# Altium footprint library Molex FFC - FPC Connectors (Through-Hole).PcbLib: 219 footprints (part 13 of 14)
Each footprint in its own frame and in the unit in brackets; x right, y up, seen from the top. Pads: shape width x height; smd on the part's side, far side on the other; paste and mask are expansions set on the pad; w line width, h text height; cw(c..) or ccw(c..) is an arc to the next point about the centre after c.
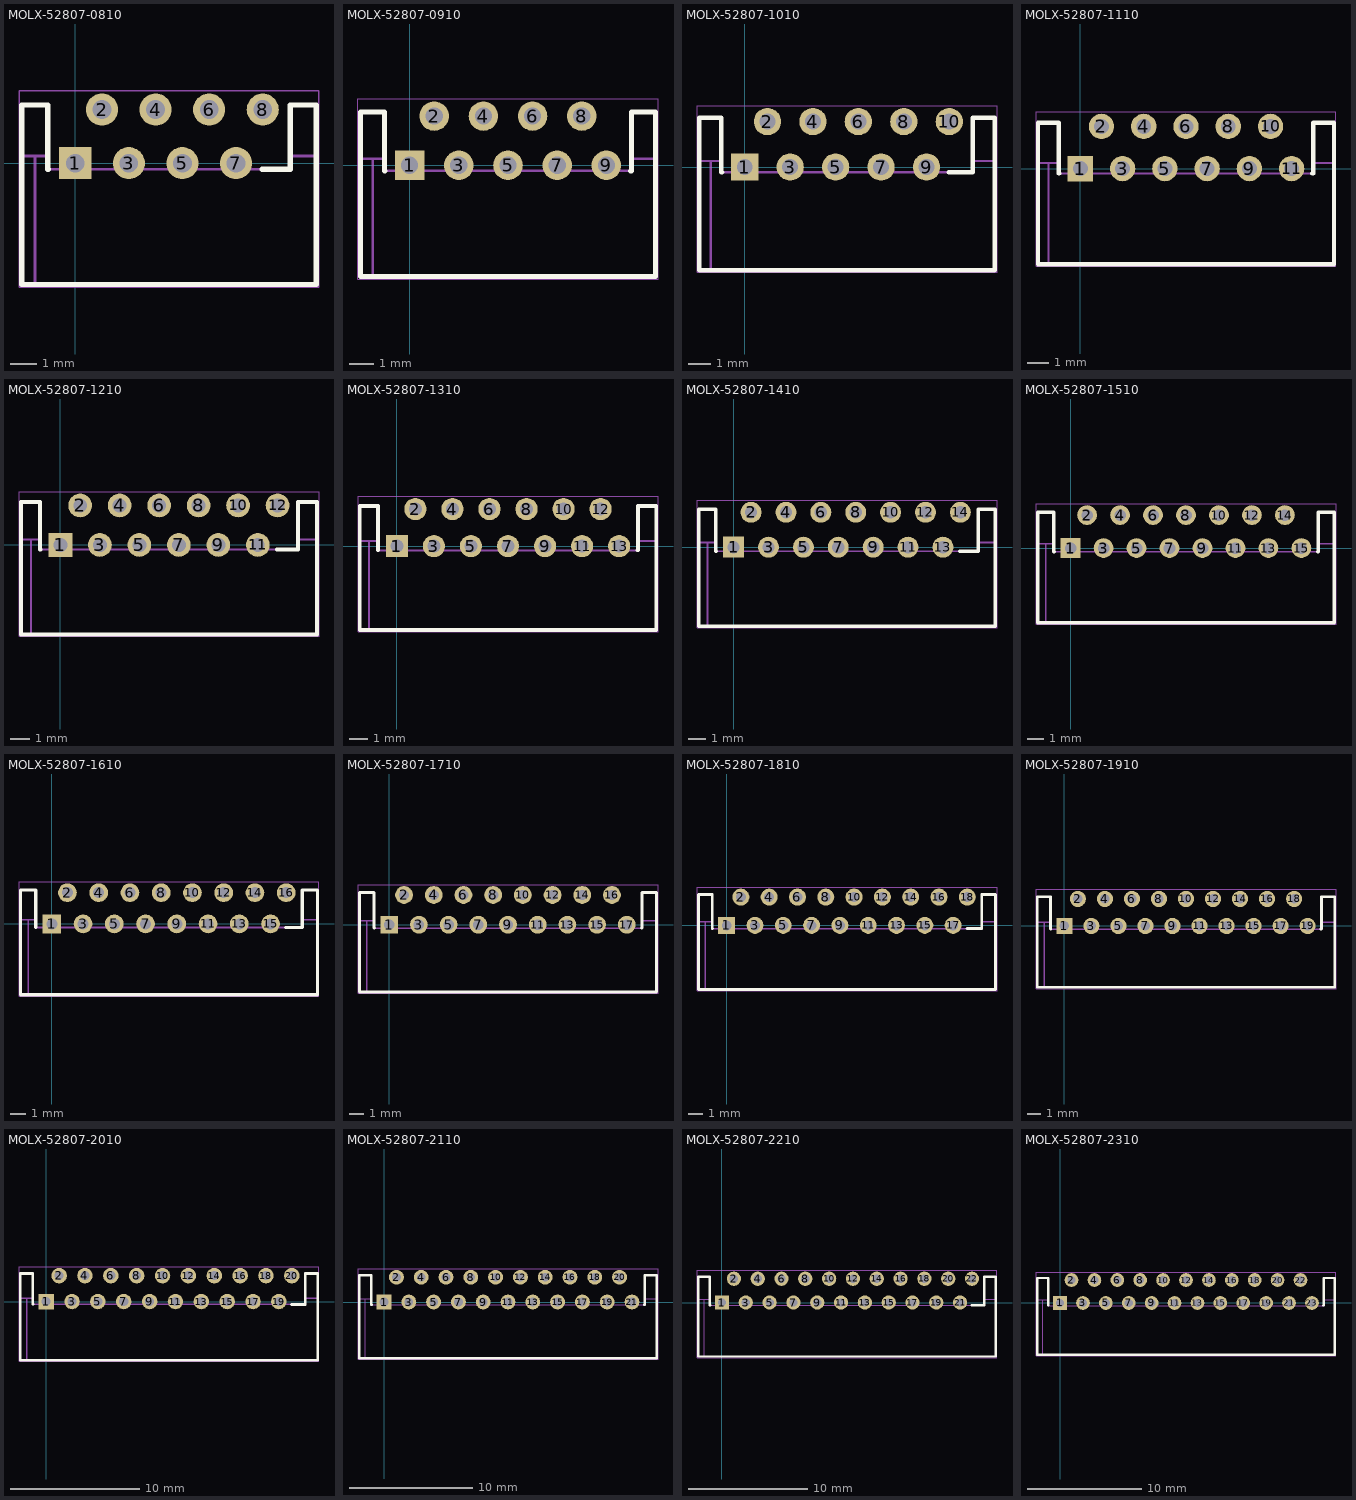
[diagram p12: the footprints below, top view; thin cyan lines are the x and y axes]

## MOLX-52807-0810 [mm] "FFC Connector, 8-Leads, Right Angle, Pitch 1.0 mm, Mated Height 3.6 mm, Through Hole"
height 3.612
pads (8):
  rect 1.2x1.2 hole 0.7: 1(0,0)
  round 1.2 hole 0.7: 2(1,2) 3(2,0) 4(3,2) 5(4,0) 6(5,2) 7(6,0) 8(7,2)
Top Overlay:
  lines w0.2: -1,-0.225 -1.025,-0.225 -1.025,2.17 -2,2.17 ; 6.973,-0.23 8.025,-0.23 8.025,2.17 9,2.17 9,-4.53 -2,-4.53 -2,2.17 ; -2,2.17 -2,2.17
Mechanical 13:
  lines w0.1: -2,0.27 -1.025,0.27 ; -1.5,-4.53 -1.5,0.27 ; 8.025,0.27 9,0.27 ; -2,-4.53 9,-4.53 9,2.17 8.025,2.17 8.025,-0.23 -1.025,-0.23 -1.025,2.17 -2,2.17 -2,-4.53
Mechanical 15:
  lines w0.05: -2.1,-4.63 9.1,-4.63 9.1,2.7 -2.1,2.7 -2.1,-4.63
3D body "52807-0810.stp": height 3.61, standoff -3.19, extent -2,-4.53 9,2.17

## MOLX-52807-0910 [mm] "FFC Connector, 9-Leads, Right Angle, Pitch 1.0 mm, Mated Height 3.6 mm, Through Hole"
height 3.612
pads (9):
  rect 1.2x1.2 hole 0.7: 1(0,0)
  round 1.2 hole 0.7: 2(1,2) 3(2,0) 4(3,2) 5(4,0) 6(5,2) 7(6,0) 8(7,2) 9(8,0)
Top Overlay:
  lines w0.2: -1,-0.23 -1.025,-0.23 -1.025,2.17 -2,2.17 ; 8.973,-0.23 9.025,-0.23 9.025,2.17 10,2.17 10,-4.53 -2,-4.53 -2,2.17 ; -2,2.17 -2,2.17
Mechanical 13:
  lines w0.1: -2,0.27 -1.025,0.27 ; -1.5,-4.53 -1.5,0.27 ; 9.025,0.27 10,0.27 ; -2,-4.53 -2,2.17 -1.025,2.17 -1.025,-0.23 9.025,-0.23 9.025,2.17 10,2.17 10,-4.53 -2,-4.53
Mechanical 15:
  lines w0.05: -2.1,-4.63 -2.1,2.7 10.1,2.7 10.1,-4.63 -2.1,-4.63
3D body "52807-0910.stp": height 3.61, standoff -3.19, extent -2,-4.53 10,2.17

## MOLX-52807-1010 [mm] "FFC Connector, 10-Leads, Right Angle, Pitch 1.0 mm, Mated Height 3.6 mm, Through Hole"
height 3.612
pads (10):
  rect 1.2x1.2 hole 0.7: 1(0,0)
  round 1.2 hole 0.7: 2(1,2) 3(2,0) 4(3,2) 5(4,0) 6(5,2) 7(6,0) 8(7,2) 9(8,0) 10(9,2)
Top Overlay:
  lines w0.2: -1,-0.225 -1.025,-0.225 -1.025,2.17 -2,2.17 ; 8.973,-0.23 10.025,-0.23 10.025,2.17 11,2.17 11,-4.53 -2,-4.53 -2,2.17 ; -2,2.17 -2,2.17
Mechanical 13:
  lines w0.1: -2,0.27 -1.025,0.27 ; -1.5,-4.53 -1.5,0.27 ; 10.025,0.27 11,0.27 ; -2,-4.53 -2,2.17 -1.025,2.17 -1.025,-0.23 10.025,-0.23 10.025,2.17 11,2.17 11,-4.53 -2,-4.53
Mechanical 15:
  lines w0.05: -2.1,-4.63 -2.1,2.7 11.1,2.7 11.1,-4.63 -2.1,-4.63
3D body "52807-1010.stp": height 3.61, standoff -3.19, extent -2,-4.53 11,2.17

## MOLX-52807-1110 [mm] "FFC Connector, 11-Leads, Right Angle, Pitch 1.0 mm, Mated Height 3.6 mm, Through Hole"
height 3.612
pads (11):
  rect 1.2x1.2 hole 0.7: 1(0,0)
  round 1.2 hole 0.7: 2(1,2) 3(2,0) 4(3,2) 5(4,0) 6(5,2) 7(6,0) 8(7,2) 9(8,0) 10(9,2) 11(10,0)
Top Overlay:
  lines w0.2: -1,-0.23 -1.025,-0.23 -1.025,2.17 -2,2.17 ; 10.973,-0.23 11.025,-0.23 11.025,2.17 12,2.17 12,-4.53 -2,-4.53 -2,2.17 ; -2,2.17 -2,2.17
Mechanical 13:
  lines w0.1: -2,0.27 -1.025,0.27 ; -1.5,-4.53 -1.5,0.27 ; 11.025,0.27 12,0.27 ; -2,-4.53 -2,2.17 -1.025,2.17 -1.025,-0.23 11.025,-0.23 11.025,2.17 12,2.17 12,-4.53 -2,-4.53
Mechanical 15:
  lines w0.05: -2.1,-4.63 -2.1,2.7 12.1,2.7 12.1,-4.63 -2.1,-4.63
3D body "52807-1110.stp": height 3.61, standoff -3.19, extent -2,-4.53 12,2.17

## MOLX-52807-1210 [mm] "FFC Connector, 12-Leads, Right Angle, Pitch 1.0 mm, Mated Height 3.6 mm, Through Hole"
height 3.612
pads (12):
  rect 1.2x1.2 hole 0.7: 1(0,0)
  round 1.2 hole 0.7: 2(1,2) 3(2,0) 4(3,2) 5(4,0) 6(5,2) 7(6,0) 8(7,2) 9(8,0) 10(9,2) 11(10,0) 12(11,2)
Top Overlay:
  lines w0.2: -1,-0.225 -1.025,-0.225 -1.025,2.17 -2,2.17 ; 10.973,-0.23 12.025,-0.23 12.025,2.17 13,2.17 13,-4.53 -2,-4.53 -2,2.17 ; -2,2.17 -2,2.17
Mechanical 13:
  lines w0.1: -2,0.27 -1.025,0.27 ; -1.5,-4.53 -1.5,0.27 ; 12.025,0.27 13,0.27 ; -2,-4.53 -2,2.17 -1.025,2.17 -1.025,-0.23 12.025,-0.23 12.025,2.17 13,2.17 13,-4.53 -2,-4.53
Mechanical 15:
  lines w0.05: -2.1,-4.63 -2.1,2.7 13.1,2.7 13.1,-4.63 -2.1,-4.63
3D body "52807-1210.stp": height 3.61, standoff -3.19, extent -2,-4.53 13,2.17

## MOLX-52807-1310 [mm] "FFC Connector, 13-Leads, Right Angle, Pitch 1.0 mm, Mated Height 3.6 mm, Through Hole"
height 3.612
pads (13):
  rect 1.2x1.2 hole 0.7: 1(0,0)
  round 1.2 hole 0.7: 2(1,2) 3(2,0) 4(3,2) 5(4,0) 6(5,2) 7(6,0) 8(7,2) 9(8,0) 10(9,2) 11(10,0) 12(11,2) 13(12,0)
Top Overlay:
  lines w0.2: -1,-0.23 -1.025,-0.23 -1.025,2.17 -2,2.17 ; 12.973,-0.23 13.025,-0.23 13.025,2.17 14,2.17 14,-4.53 -2,-4.53 -2,2.17 ; -2,2.17 -2,2.17
Mechanical 13:
  lines w0.1: -2,0.27 -1.025,0.27 ; -1.5,-4.53 -1.5,0.27 ; 13.025,0.27 14,0.27 ; -2,-4.53 -2,2.17 -1.025,2.17 -1.025,-0.23 13.025,-0.23 13.025,2.17 14,2.17 14,-4.53 -2,-4.53
Mechanical 15:
  lines w0.05: -2.1,-4.63 -2.1,2.7 14.1,2.7 14.1,-4.63 -2.1,-4.63
3D body "52807-1310.stp": height 3.61, standoff -3.19, extent -2,-4.53 14,2.17

## MOLX-52807-1410 [mm] "FFC Connector, 14-Leads, Right Angle, Pitch 1.0 mm, Mated Height 3.6 mm, Through Hole"
height 3.612
pads (14):
  rect 1.2x1.2 hole 0.7: 1(0,0)
  round 1.2 hole 0.7: 2(1,2) 3(2,0) 4(3,2) 5(4,0) 6(5,2) 7(6,0) 8(7,2) 9(8,0) 10(9,2) 11(10,0) 12(11,2) 13(12,0) 14(13,2)
Top Overlay:
  lines w0.2: -1,-0.225 -1.025,-0.225 -1.025,2.17 -2,2.17 ; 12.973,-0.23 14.025,-0.23 14.025,2.17 15,2.17 15,-4.53 -2,-4.53 -2,2.17 ; -2,2.17 -2,2.17
Mechanical 13:
  lines w0.1: -2,0.27 -1.025,0.27 ; -1.5,-4.53 -1.5,0.27 ; 14.025,0.27 15,0.27 ; -2,-4.53 -2,2.17 -1.025,2.17 -1.025,-0.23 14.025,-0.23 14.025,2.17 15,2.17 15,-4.53 -2,-4.53
Mechanical 15:
  lines w0.05: -2.1,-4.63 -2.1,2.7 15.1,2.7 15.1,-4.63 -2.1,-4.63
3D body "52807-1410.stp": height 3.61, standoff -3.19, extent -2,-4.53 15,2.17

## MOLX-52807-1510 [mm] "FFC Connector, 15-Leads, Right Angle, Pitch 1.0 mm, Mated Height 3.6 mm, Through Hole"
height 3.612
pads (15):
  rect 1.2x1.2 hole 0.7: 1(0,0)
  round 1.2 hole 0.7: 2(1,2) 3(2,0) 4(3,2) 5(4,0) 6(5,2) 7(6,0) 8(7,2) 9(8,0) 10(9,2) 11(10,0) 12(11,2) 13(12,0) 14(13,2)
  round 1.2 hole 0.7 mask+0.102: 15(14,0)
Top Overlay:
  lines w0.2: -1,-0.23 -1.025,-0.23 -1.025,2.17 -2,2.17 ; 14.973,-0.23 15.025,-0.23 15.025,2.17 16,2.17 16,-4.53 -2,-4.53 -2,2.17 ; -2,2.17 -2,2.17
Mechanical 13:
  lines w0.1: -2,0.27 -1.041,0.27 ; -1.5,-4.53 -1.5,0.27 ; 15.025,0.27 16,0.27 ; -2,-4.53 -2,2.17 -1.025,2.17 -1.025,-0.23 15.025,-0.23 15.025,2.17 16,2.17 16,-4.53 -2,-4.53
Mechanical 15:
  lines w0.05: -2.1,-4.63 -2.1,2.7 16.1,2.7 16.1,-4.63 -2.1,-4.63
3D body "52807-1510.stp": height 3.61, standoff -3.19, extent -2,-4.53 16,2.17

## MOLX-52807-1610 [mm] "FFC Connector, 16-Leads, Right Angle, Pitch 1.0 mm, Mated Height 3.6 mm, Through Hole"
height 3.612
pads (16):
  rect 1.2x1.2 hole 0.7: 1(0,0)
  round 1.2 hole 0.7: 2(1,2) 3(2,0) 4(3,2) 5(4,0) 6(5,2) 7(6,0) 8(7,2) 9(8,0) 10(9,2) 11(10,0) 12(11,2) 13(12,0) 14(13,2) 15(14,0) 16(15,2)
Top Overlay:
  lines w0.2: -1,-0.225 -1.025,-0.225 -1.025,2.17 -2,2.17 ; 14.973,-0.23 16.025,-0.23 16.025,2.17 17,2.17 17,-4.53 -2,-4.53 -2,2.17 ; -2,2.17 -2,2.17
Mechanical 13:
  lines w0.1: -2,0.27 -1.025,0.27 ; -1.5,-4.53 -1.5,0.27 ; 16.025,0.27 17,0.27 ; -2,-4.53 -2,2.17 -1.025,2.17 -1.025,-0.23 16.025,-0.23 16.025,2.17 17,2.17 17,-4.53 -2,-4.53
Mechanical 15:
  lines w0.05: -2.1,-4.63 -2.1,2.7 17.1,2.7 17.1,-4.63 -2.1,-4.63
3D body "52807-1610.stp": height 3.61, standoff -3.19, extent -2,-4.53 17,2.17

## MOLX-52807-1710 [mm] "FFC Connector, 17-Leads, Right Angle, Pitch 1.0 mm, Mated Height 3.6 mm, Through Hole"
height 3.612
pads (17):
  rect 1.2x1.2 hole 0.7: 1(0,0)
  round 1.2 hole 0.7: 2(1,2) 3(2,0) 4(3,2) 5(4,0) 6(5,2) 7(6,0) 8(7,2) 9(8,0) 10(9,2) 11(10,0) 12(11,2) 13(12,0) 14(13,2) 16(15,2)
  round 1.2 hole 0.7 mask+0.102: 15(14,0) 17(16,0)
Top Overlay:
  lines w0.2: -1,-0.23 -1.025,-0.23 -1.025,2.17 -2,2.17 ; 16.973,-0.23 17.025,-0.23 17.025,2.17 18,2.17 18,-4.53 -2,-4.53 -2,2.17 ; -2,2.17 -2,2.17
Mechanical 13:
  lines w0.1: -2,0.27 -1.025,0.27 ; -1.5,-4.53 -1.5,0.27 ; 17.025,0.27 18,0.27 ; -2,-4.53 -2,2.17 -1.025,2.17 -1.025,-0.23 17.025,-0.23 17.025,2.17 18,2.17 18,-4.53 -2,-4.53
Mechanical 15:
  lines w0.05: -2.1,-4.63 -2.1,2.7 18.1,2.7 18.1,-4.63 -2.1,-4.63
3D body "52807-1710.stp": height 3.61, standoff -3.19, extent -2,-4.53 18,2.17

## MOLX-52807-1810 [mm] "FFC Connector, 18-Leads, Right Angle, Pitch 1.0 mm, Mated Height 3.6 mm, Through Hole"
height 3.612
pads (18):
  rect 1.2x1.2 hole 0.7: 1(0,0)
  round 1.2 hole 0.7: 2(1,2) 3(2,0) 4(3,2) 5(4,0) 6(5,2) 7(6,0) 8(7,2) 9(8,0) 10(9,2) 11(10,0) 12(11,2) 13(12,0) 14(13,2) 15(14,0) 16(15,2) 17(16,0) 18(17,2)
Top Overlay:
  lines w0.2: -1,-0.225 -1.025,-0.225 -1.025,2.17 -2,2.17 ; 16.973,-0.23 18.025,-0.23 18.025,2.17 19,2.17 19,-4.53 -2,-4.53 -2,2.17 ; -2,2.17 -2,2.17
Mechanical 13:
  lines w0.1: -2,0.27 -1.025,0.27 ; -1.5,-4.53 -1.5,0.27 ; 18.025,0.27 19,0.27 ; -2,-4.53 -2,2.17 -1.025,2.17 -1.025,-0.23 18.025,-0.23 18.025,2.17 19,2.17 19,-4.53 -2,-4.53
Mechanical 15:
  lines w0.05: -2.1,-4.63 -2.1,2.7 19.1,2.7 19.1,-4.63 -2.1,-4.63
3D body "52807-1810.stp": height 3.61, standoff -3.19, extent -2,-4.53 19,2.17

## MOLX-52807-1910 [mm] "FFC Connector, 19-Leads, Right Angle, Pitch 1.0 mm, Mated Height 3.6 mm, Through Hole"
height 3.612
pads (19):
  rect 1.2x1.2 hole 0.7: 1(0,0)
  round 1.2 hole 0.7: 2(1,2) 3(2,0) 4(3,2) 5(4,0) 6(5,2) 7(6,0) 8(7,2) 9(8,0) 10(9,2) 11(10,0) 12(11,2) 13(12,0) 14(13,2) 16(15,2) 18(17,2)
  round 1.2 hole 0.7 mask+0.102: 15(14,0) 17(16,0) 19(18,0)
Top Overlay:
  lines w0.2: -1,-0.23 -1.025,-0.23 -1.025,2.17 -2,2.17 ; 18.973,-0.23 19.025,-0.23 19.025,2.17 20,2.17 20,-4.53 -2,-4.53 -2,2.17 ; -2,2.17 -2,2.17
Mechanical 13:
  lines w0.1: -2,0.27 -1.025,0.27 ; -1.5,-4.53 -1.5,0.27 ; 19.025,0.27 20,0.27 ; -2,-4.53 20,-4.53 20,2.17 19.025,2.17 19.025,-0.23 -1.025,-0.23 -1.025,2.17 -2,2.17 -2,-4.53
Mechanical 15:
  lines w0.05: -2.1,-4.63 20.1,-4.63 20.1,2.7 -2.1,2.7 -2.1,-4.63
3D body "52807-1910.stp": height 3.61, standoff -3.19, extent -2,-4.53 20,2.17

## MOLX-52807-2010 [mm] "FFC Connector, 20-Leads, Right Angle, Pitch 1.0 mm, Mated Height 3.6 mm, Through Hole"
height 3.612
pads (20):
  rect 1.2x1.2 hole 0.7: 1(0,0)
  round 1.2 hole 0.7: 2(1,2) 3(2,0) 4(3,2) 5(4,0) 6(5,2) 7(6,0) 8(7,2) 9(8,0) 10(9,2) 11(10,0) 12(11,2) 13(12,0) 14(13,2) 15(14,0) 16(15,2) 17(16,0) 18(17,2) 19(18,0) 20(19,2)
Top Overlay:
  lines w0.2: -1,-0.225 -1.025,-0.225 -1.025,2.17 -2,2.17 ; 18.973,-0.23 20.025,-0.23 20.025,2.17 21,2.17 21,-4.53 -2,-4.53 -2,2.17 ; -2,2.17 -2,2.17
Mechanical 13:
  lines w0.1: -2,0.27 -1.025,0.27 ; -1.5,-4.53 -1.5,0.27 ; 20.025,0.27 21,0.27 ; -2,-4.53 -2,2.17 -1.025,2.17 -1.025,-0.23 20.025,-0.23 20.025,2.17 21,2.17 21,-4.53 -2,-4.53
Mechanical 15:
  lines w0.05: -2.1,-4.63 -2.1,2.7 21.1,2.7 21.1,-4.63 -2.1,-4.63
3D body "52807-2010.stp": height 3.61, standoff -3.19, extent -2,-4.53 21,2.17

## MOLX-52807-2110 [mm] "FFC Connector, 21-Leads, Right Angle, Pitch 1.0 mm, Mated Height 3.6 mm, Through Hole"
height 3.612
pads (21):
  rect 1.2x1.2 hole 0.7: 1(0,0)
  round 1.2 hole 0.7: 2(1,2) 3(2,0) 4(3,2) 5(4,0) 6(5,2) 7(6,0) 8(7,2) 9(8,0) 10(9,2) 11(10,0) 12(11,2) 13(12,0) 14(13,2) 16(15,2) 18(17,2) 20(19,2)
  round 1.2 hole 0.7 mask+0.102: 15(14,0) 17(16,0) 19(18,0) 21(20,0)
Top Overlay:
  lines w0.2: -1,-0.23 -1.025,-0.23 -1.025,2.17 -2,2.17 ; 20.973,-0.23 21.025,-0.23 21.025,2.17 22,2.17 22,-4.53 -2,-4.53 -2,2.17 ; -2,2.17 -2,2.17
Mechanical 13:
  lines w0.1: -2,0.27 -1.025,0.27 ; -1.5,-4.53 -1.5,0.27 ; 21.025,0.27 22,0.27 ; -2,-4.53 -2,2.17 -1.025,2.17 -1.025,-0.23 21.025,-0.23 21.025,2.17 22,2.17 22,-4.53 -2,-4.53
Mechanical 15:
  lines w0.05: -2.1,-4.63 -2.1,2.7 22.1,2.7 22.1,-4.63 -2.1,-4.63
3D body "52807-2110.stp": height 3.61, standoff -3.19, extent -2,-4.53 22,2.17

## MOLX-52807-2210 [mm] "FFC Connector, 22-Leads, Right Angle, Pitch 1.0 mm, Mated Height 3.6 mm, Through Hole"
height 3.612
pads (22):
  rect 1.2x1.2 hole 0.7: 1(0,0)
  round 1.2 hole 0.7: 2(1,2) 3(2,0) 4(3,2) 5(4,0) 6(5,2) 7(6,0) 8(7,2) 9(8,0) 10(9,2) 11(10,0) 12(11,2) 13(12,0) 14(13,2) 15(14,0) 16(15,2) 17(16,0) 18(17,2) 19(18,0) 20(19,2) 21(20,0) 22(21,2)
Top Overlay:
  lines w0.2: -1,-0.225 -1.025,-0.225 -1.025,2.17 -2,2.17 ; 20.973,-0.23 22.025,-0.23 22.025,2.17 23,2.17 23,-4.53 -2,-4.53 -2,2.17 ; -2,2.17 -2,2.17
Mechanical 13:
  lines w0.1: -2,0.27 -1.025,0.27 ; -1.5,-4.53 -1.5,0.27 ; 22.025,0.27 23,0.27 ; -2,-4.53 -2,2.17 -1.025,2.17 -1.025,-0.23 22.025,-0.23 22.025,2.17 23,2.17 23,-4.53 -2,-4.53
Mechanical 15:
  lines w0.05: -2.1,-4.63 -2.1,2.7 23.1,2.7 23.1,-4.63 -2.1,-4.63
3D body "52807-2210.stp": height 3.61, standoff -3.19, extent -2,-4.53 23,2.17

## MOLX-52807-2310 [mm] "FFC Connector, 23-Leads, Right Angle, Pitch 1.0 mm, Mated Height 3.6 mm, Through Hole"
height 3.612
pads (23):
  rect 1.2x1.2 hole 0.7: 1(0,0)
  round 1.2 hole 0.7: 2(1,2) 3(2,0) 4(3,2) 5(4,0) 6(5,2) 7(6,0) 8(7,2) 9(8,0) 10(9,2) 11(10,0) 12(11,2) 13(12,0) 14(13,2) 16(15,2) 18(17,2) 20(19,2) 22(21,2)
  round 1.2 hole 0.7 mask+0.102: 15(14,0) 17(16,0) 19(18,0) 21(20,0) 23(22,0)
Top Overlay:
  lines w0.2: -1,-0.23 -1.025,-0.23 -1.025,2.17 -2,2.17 ; 22.973,-0.23 23.025,-0.23 23.025,2.17 24,2.17 24,-4.53 -2,-4.53 -2,2.17 ; -2,2.17 -2,2.17
Mechanical 13:
  lines w0.1: -2,0.27 -1.025,0.27 ; -1.5,-4.53 -1.5,0.27 ; 23.025,0.27 24,0.27 ; -2,-4.53 -2,2.17 -1.025,2.17 -1.025,-0.23 23.025,-0.23 23.025,2.17 24,2.17 24,-4.53 -2,-4.53
Mechanical 15:
  lines w0.05: -2.1,-4.63 -2.1,2.7 24.1,2.7 24.1,-4.63 -2.1,-4.63
3D body "52807-2310.stp": height 3.61, standoff -3.19, extent -2,-4.53 24,2.17